# Altium footprint library FootprintSMD.PcbLib: 140 footprints (part 8 of 9)
Each footprint in its own frame and in the unit in brackets; x right, y up, seen from the top. Pads: shape width x height; smd on the part's side, far side on the other; paste and mask are expansions set on the pad; w line width, h text height; cw(c..) or ccw(c..) is an arc to the next point about the centre after c.
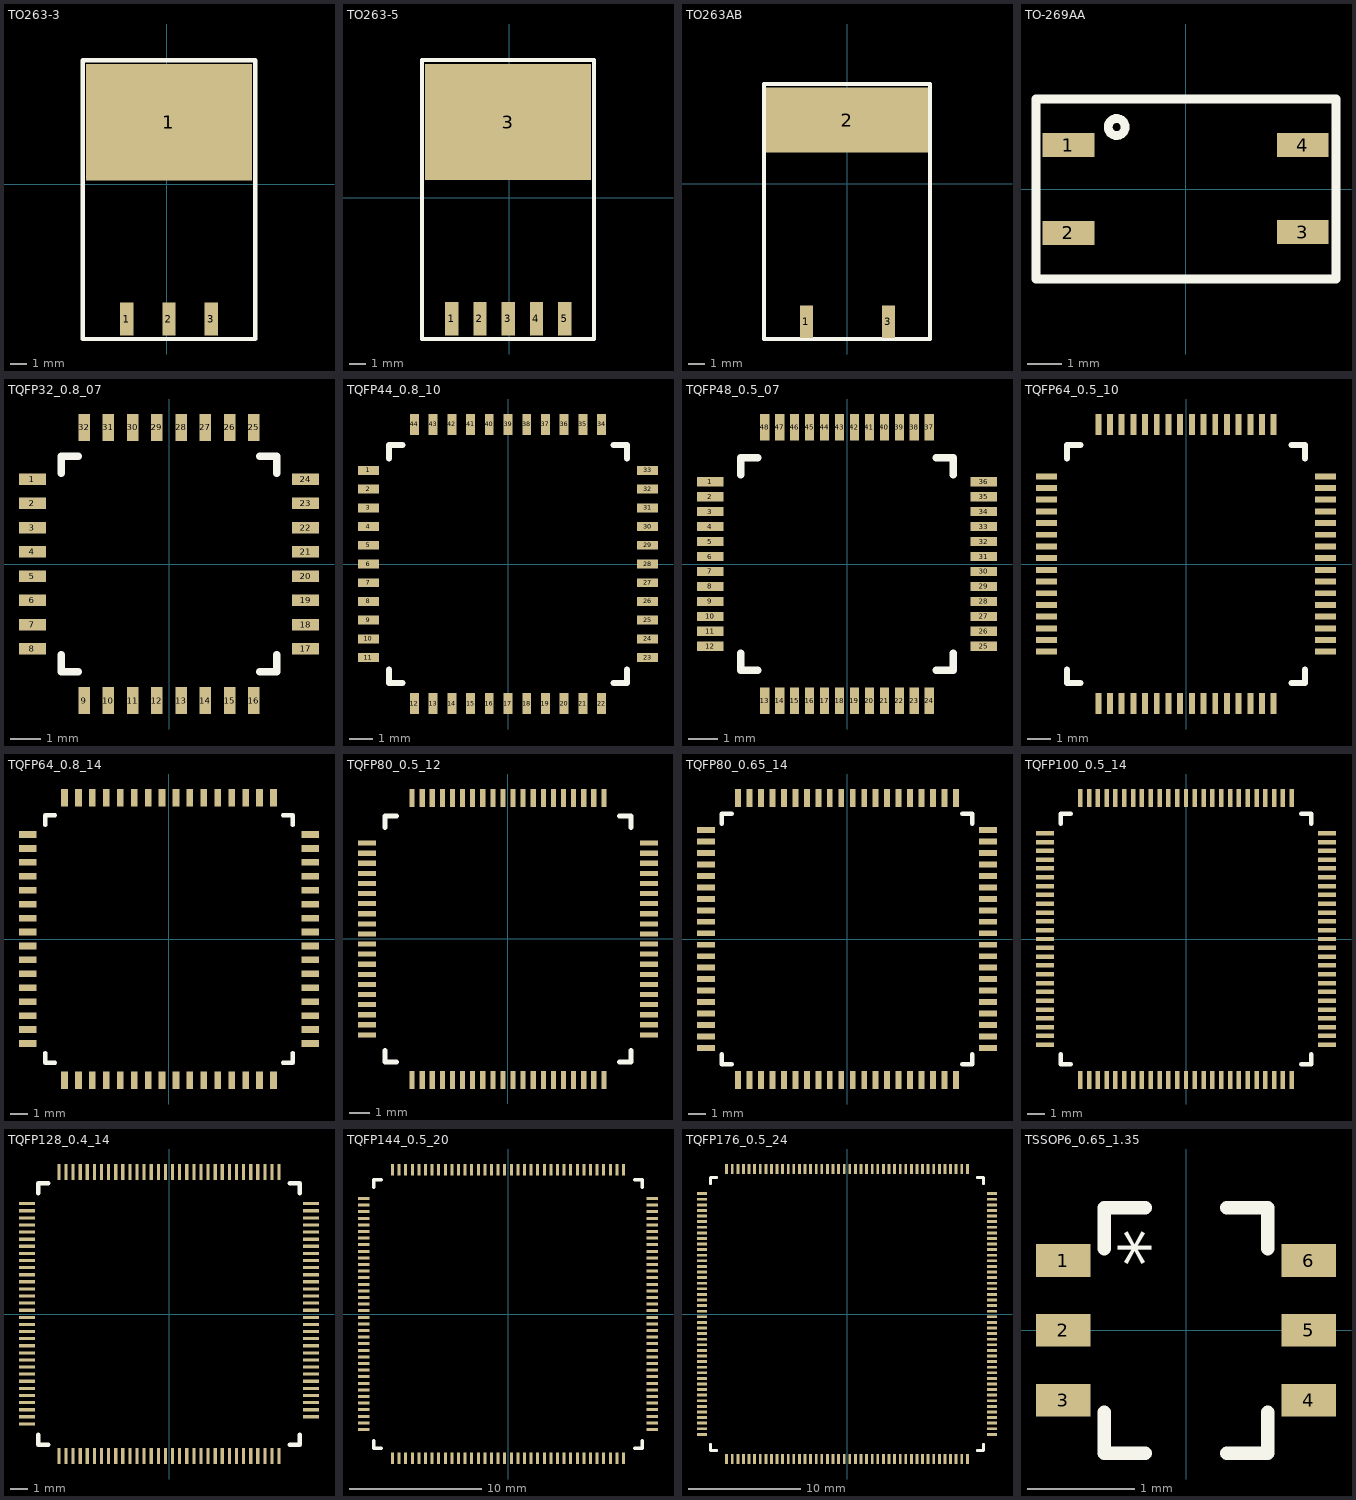
[diagram p7: the footprints below, top view; thin cyan lines are the x and y axes]

## TO263-3 [mm]
pads (4):
  rect 0.8x2 smd: 1(-2.418,-8.095) 2(0.122,-8.095) 3(2.662,-8.095)
  rect 10x7 smd: 1(0.122,3.741)
Top Overlay:
  lines w0.254: -5.055,-9.296 5.309,-9.296 5.309,7.468 -5.055,7.468 -5.055,-6.262 -5.055,-9.296
3D body "SW3dPS-TO263-3.STEP": height 4.78, standoff -0.02, extent -4.878,-8.742 5.122,6.928

## TO263-5 [mm]
pads (6):
  rect 0.8x2 smd: 1(-3.454,-7.286) 2(-1.754,-7.286) 3(-0.054,-7.286) 4(1.646,-7.286) 5(3.346,-7.286)
  rect 10x7 smd: 3(-0.054,4.55)
Top Overlay:
  lines w0.254: -5.232,-8.509 5.105,-8.509 5.105,8.28 -5.232,8.28 -5.232,-5.454 -5.232,-8.509
3D body "SW3dPS-TO263-5.STEP": height 4.79, standoff -0.01, extent -5.054,-7.933 4.946,7.737

## TO263AB [mm]
pads (3):
  rect 0.8x2 smd: 1(-2.525,-8.475) 3(2.525,-8.475)
  rect 10x4 smd: 2(-0.025,3.925)
Top Overlay:
  lines w0.254: 5.075,-9.55 5.075,6.147 -5.125,6.147 -5.125,-9.55 5.075,-9.55 ; 5.075,-9.55 5.075,-9.55
3D body "SW3dPS-DPAK.STEP": height 4.98, standoff -0.03, extent -5.08,-9.416 5.08,5.848

## TO-269AA [mm]
pads (4):
  rect 1.5x0.7 smd: 1(-3.4,1.275) 2(-3.4,-1.275) 3(3.4,-1.25) 4(3.4,1.275)
Top Overlay:
  circle w0.254: c-2,1.8 r0.246
  lines w0.254: -4.343,-2.616 -4.343,2.616 4.369,2.616 4.369,-2.616 -4.343,-2.616
3D body "User Library-TO-269AA_jam.STEP": height 2.7, standoff 0, extent -3.52,-2.475 3.52,2.475

## TQFP32_0.8_07 [mil]
pads (32):
  rect 35x15 smd: 1(-177.32,110.24) 2(-177.32,78.74) 3(-177.32,47.24) 4(-177.32,15.75) 5(-177.32,-15.75) 6(-177.32,-47.24) 7(-177.32,-78.74) 8(-177.32,-110.24) 17(177.32,-110.24) 18(177.32,-78.74) 19(177.32,-47.24) 20(177.32,-15.75) 21(177.32,15.75) 22(177.32,47.24) 23(177.32,78.74) 24(177.32,110.24)
  rect 15x35 smd: 9(-110.24,-177.32) 10(-78.74,-177.32) 11(-47.24,-177.32) 12(-15.75,-177.32) 13(15.75,-177.32) 14(47.24,-177.32) 15(78.74,-177.32) 16(110.24,-177.32) 25(110.24,177.32) 26(78.74,177.32) 27(47.24,177.32) 28(15.75,177.32) 29(-15.75,177.32) 30(-47.24,177.32) 31(-78.74,177.32) 32(-110.24,177.32)
Top Overlay:
  lines w10: -140,-117.87 -140,-140 -117.87,-140 ; -140,117.87 -140,140 -117.87,140 ; 117.87,-140 140,-140 140,-117.87 ; 117.87,140 140,140 140,117.87
3D body "User Library-LQFP32-0_8.STEP": height 64.96, standoff -0.52, extent -177.17,-177.92 178.68,177.92

## TQFP44_0.8_10 [mil]
pads (44):
  rect 35x15 smd: 1(-235,157.48) 2(-235,125.98) 3(-235,94.49) 4(-235,62.99) 5(-235,31.5) 6(-235,0) 7(-235,-31.5) 8(-235,-62.99) 9(-235,-94.49) 10(-235,-125.98) 11(-235,-157.48) 23(235,-157.48) 24(235,-125.98) 25(235,-94.49) 26(235,-62.99) 27(235,-31.5) 28(235,0) 29(235,31.5) 30(235,62.99) 31(235,94.49) 32(235,125.98) 33(235,157.48)
  rect 15x35 smd: 12(-157.48,-235) 13(-125.98,-235) 14(-94.49,-235) 15(-62.99,-235) 16(-31.5,-235) 17(0,-235) 18(31.5,-235) 19(62.99,-235) 20(94.49,-235) 21(125.98,-235) 22(157.48,-235) 34(157.48,235) 35(125.98,235) 36(94.49,235) 37(62.99,235) 38(31.5,235) 39(0,235) 40(-31.5,235) 41(-62.99,235) 42(-94.49,235) 43(-125.98,235) 44(-157.48,235)
Top Overlay:
  lines w10: -200,-177.87 -200,-200 -177.87,-200 ; -200,177.87 -200,200 -177.87,200 ; 177.87,-200 200,-200 200,-177.87 ; 177.87,200 200,200 200,177.87
3D body "User Library-TQFP-44-1.STEP": height 43.31, standoff 0, extent -236.22,-236.22 236.22,236.22

## TQFP48_0.5_07 [mil]
pads (48):
  rect 35x12 smd: 1(-180,108.27) 2(-180,88.58) 3(-180,68.9) 4(-180,49.21) 5(-180,29.53) 6(-180,9.84) 7(-180,-9.84) 8(-180,-29.53) 9(-180,-49.21) 10(-180,-68.9) 11(-180,-88.58) 12(-180,-108.27) 25(180,-108.27) 26(180,-88.58) 27(180,-68.9) 28(180,-49.21) 29(180,-29.53) 30(180,-9.84) 31(180,9.84) 32(180,29.53) 33(180,49.21) 34(180,68.9) 35(180,88.58) 36(180,108.27)
  rect 12x35 smd: 13(-108.27,-180) 14(-88.58,-180) 15(-68.9,-180) 16(-49.21,-180) 17(-29.53,-180) 18(-9.84,-180) 19(9.84,-180) 20(29.53,-180) 21(49.21,-180) 22(68.9,-180) 23(88.58,-180) 24(108.27,-180) 37(108.27,180) 38(88.58,180) 39(68.9,180) 40(49.21,180) 41(29.53,180) 42(9.84,180) 43(-9.84,180) 44(-29.53,180) 45(-49.21,180) 46(-68.9,180) 47(-88.58,180) 48(-108.27,180)
Top Overlay:
  lines w10: -140,-117.87 -140,-140 -117.87,-140 ; -140,117.87 -140,140 -117.87,140 ; 117.87,-140 140,-140 140,-117.87 ; 117.87,140 140,140 140,117.87
3D body "User Library-LQFP48.STEP": height 59.06, standoff 0, extent -177.16,-177.17 177.17,177.16

## TQFP64_0.5_10 [mil]
pads (64):
  rect 35x10 smd: 1(-235,147.64) 2(-235,127.95) 3(-235,108.27) 4(-235,88.58) 5(-235,68.9) 6(-235,49.21) 7(-235,29.53) 8(-235,9.84) 9(-235,-9.84) 10(-235,-29.53) 11(-235,-49.21) 12(-235,-68.9) 13(-235,-88.58) 14(-235,-108.27) 15(-235,-127.95) 16(-235,-147.64) 33(235,-147.64) 34(235,-127.95) 35(235,-108.27) 36(235,-88.58) 37(235,-68.9) 38(235,-49.21) 39(235,-29.53) 40(235,-9.84) 41(235,9.84) 42(235,29.53) 43(235,49.21) 44(235,68.9) 45(235,88.58) 46(235,108.27) 47(235,127.95) 48(235,147.64)
  rect 10x35 smd: 17(-147.64,-235) 18(-127.95,-235) 19(-108.27,-235) 20(-88.58,-235) 21(-68.9,-235) 22(-49.21,-235) 23(-29.53,-235) 24(-9.84,-235) 25(9.84,-235) 26(29.53,-235) 27(49.21,-235) 28(68.9,-235) 29(88.58,-235) 30(108.27,-235) 31(127.95,-235) 32(147.64,-235) 49(147.64,235) 50(127.95,235) 51(108.27,235) 52(88.58,235) 53(68.9,235) 54(49.21,235) 55(29.53,235) 56(9.84,235) 57(-9.84,235) 58(-29.53,235) 59(-49.21,235) 60(-68.9,235) 61(-88.58,235) 62(-108.27,235) 63(-127.95,235) 64(-147.64,235)
Top Overlay:
  lines w10: -200,-177.87 -200,-200 -177.87,-200 ; -200,177.87 -200,200 -177.87,200 ; 177.87,-200 200,-200 200,-177.87 ; 177.87,200 200,200 200,177.87
3D body "User Library-lqpf64.STEP": height 59.06, standoff 0.79, extent -236.21,-236.21 236.23,236.23

## TQFP64_0.8_14 [mil]
pads (64):
  rect 40x15 smd: 1(-319.21,236.22) 2(-319.21,204.72) 3(-319.21,173.23) 4(-319.21,141.73) 5(-319.21,110.24) 6(-319.21,78.74) 7(-319.21,47.24) 8(-319.21,15.75) 9(-319.21,-15.75) 10(-319.21,-47.24) 11(-319.21,-78.74) 12(-319.21,-110.24) 13(-319.21,-141.73) 14(-319.21,-173.23) 15(-319.21,-204.72) 16(-319.21,-236.22) 33(319.21,-236.22) 34(319.21,-204.72) 35(319.21,-173.23) 36(319.21,-141.73) 37(319.21,-110.24) 38(319.21,-78.74) 39(319.21,-47.24) 40(319.21,-15.75) 41(319.21,15.75) 42(319.21,47.24) 43(319.21,78.74) 44(319.21,110.24) 45(319.21,141.73) 46(319.21,173.23) 47(319.21,204.72) 48(319.21,236.22)
  rect 15x40 smd: 17(-236.22,-319.21) 18(-204.72,-319.21) 19(-173.23,-319.21) 20(-141.73,-319.21) 21(-110.24,-319.21) 22(-78.74,-319.21) 23(-47.24,-319.21) 24(-15.75,-319.21) 25(15.75,-319.21) 26(47.24,-319.21) 27(78.74,-319.21) 28(110.24,-319.21) 29(141.73,-319.21) 30(173.23,-319.21) 31(204.72,-319.21) 32(236.22,-319.21) 49(236.22,319.21) 50(204.72,319.21) 51(173.23,319.21) 52(141.73,319.21) 53(110.24,319.21) 54(78.74,319.21) 55(47.24,319.21) 56(15.75,319.21) 57(-15.75,319.21) 58(-47.24,319.21) 59(-78.74,319.21) 60(-110.24,319.21) 61(-141.73,319.21) 62(-173.23,319.21) 63(-204.72,319.21) 64(-236.22,319.21)
Top Overlay:
  lines w10: -280,-257.87 -280,-280 -257.87,-280 ; -280,257.87 -280,280 -257.87,280 ; 257.87,-280 280,-280 280,-257.87 ; 257.87,280 280,280 280,257.87
3D body "User Library-TQFP 64 14x14mm 0_8mm pitch.STEP": height 58.27, standoff -0.79, extent -314.95,-314.95 314.97,314.97

## TQFP80_0.5_12 [mil]
pads (80):
  rect 35x10 smd: 1(-275,187.01) 2(-275,167.32) 3(-275,147.64) 4(-275,127.95) 5(-275,108.27) 6(-275,88.58) 7(-275,68.9) 8(-275,49.21) 9(-275,29.53) 10(-275,9.84) 11(-275,-9.84) 12(-275,-29.53) 13(-275,-49.21) 14(-275,-68.9) 15(-275,-88.58) 16(-275,-108.27) 17(-275,-127.95) 18(-275,-147.64) 19(-275,-167.32) 20(-275,-187.01) 41(275,-187.01) 42(275,-167.32) 43(275,-147.64) 44(275,-127.95) 45(275,-108.27) 46(275,-88.58) 47(275,-68.9) 48(275,-49.21) 49(275,-29.53) 50(275,-9.84) 51(275,9.84) 52(275,29.53) 53(275,49.21) 54(275,68.9) 55(275,88.58) 56(275,108.27) 57(275,127.95) 58(275,147.64) 59(275,167.32) 60(275,187.01)
  rect 10x35 smd: 21(-187.01,-275) 22(-167.32,-275) 23(-147.64,-275) 24(-127.95,-275) 25(-108.27,-275) 26(-88.58,-275) 27(-68.9,-275) 28(-49.21,-275) 29(-29.53,-275) 30(-9.84,-275) 31(9.84,-275) 32(29.53,-275) 33(49.21,-275) 34(68.9,-275) 35(88.58,-275) 36(108.27,-275) 37(127.95,-275) 38(147.64,-275) 39(167.32,-275) 40(187.01,-275) 61(187.01,275) 62(167.32,275) 63(147.64,275) 64(127.95,275) 65(108.27,275) 66(88.58,275) 67(68.9,275) 68(49.21,275) 69(29.53,275) 70(9.84,275) 71(-9.84,275) 72(-29.53,275) 73(-49.21,275) 74(-68.9,275) 75(-88.58,275) 76(-108.27,275) 77(-127.95,275) 78(-147.64,275) 79(-167.32,275) 80(-187.01,275)
Top Overlay:
  lines w10: -240,-217.87 -240,-240 -217.87,-240 ; -240,217.87 -240,240 -217.87,240 ; 217.87,-240 240,-240 240,-217.87 ; 217.87,240 240,240 240,217.87
3D body "User Library-TQFP-80.STEP": height 41.34, standoff -0.39, extent -275.58,-275.59 275.6,275.59

## TQFP80_0.65_14 [mil]
pads (80):
  rect 40x13 smd: 1(-315,243.11) 2(-315,217.52) 3(-315,191.93) 4(-315,166.34) 5(-315,140.75) 6(-315,115.16) 7(-315,89.57) 8(-315,63.98) 9(-315,38.39) 10(-315,12.8) 11(-315,-12.8) 12(-315,-38.39) 13(-315,-63.98) 14(-315,-89.57) 15(-315,-115.16) 16(-315,-140.75) 17(-315,-166.34) 18(-315,-191.93) 19(-315,-217.52) 20(-315,-243.11) 41(315,-243.11) 42(315,-217.52) 43(315,-191.93) 44(315,-166.34) 45(315,-140.75) 46(315,-115.16) 47(315,-89.57) 48(315,-63.98) 49(315,-38.39) 50(315,-12.8) 51(315,12.8) 52(315,38.39) 53(315,63.98) 54(315,89.57) 55(315,115.16) 56(315,140.75) 57(315,166.34) 58(315,191.93) 59(315,217.52) 60(315,243.11)
  rect 13x40 smd: 21(-243.11,-315) 22(-217.52,-315) 23(-191.93,-315) 24(-166.34,-315) 25(-140.75,-315) 26(-115.16,-315) 27(-89.57,-315) 28(-63.98,-315) 29(-38.39,-315) 30(-12.8,-315) 31(12.8,-315) 32(38.39,-315) 33(63.98,-315) 34(89.57,-315) 35(115.16,-315) 36(140.75,-315) 37(166.34,-315) 38(191.93,-315) 39(217.52,-315) 40(243.11,-315) 61(243.11,315) 62(217.52,315) 63(191.93,315) 64(166.34,315) 65(140.75,315) 66(115.16,315) 67(89.57,315) 68(63.98,315) 69(38.39,315) 70(12.8,315) 71(-12.8,315) 72(-38.39,315) 73(-63.98,315) 74(-89.57,315) 75(-115.16,315) 76(-140.75,315) 77(-166.34,315) 78(-191.93,315) 79(-217.52,315) 80(-243.11,315)
Top Overlay:
  lines w10: -280,-257.87 -280,-280 -257.87,-280 ; -280,257.87 -280,280 -257.87,280 ; 257.87,-280 280,-280 280,-257.87 ; 257.87,280 280,280 280,257.87
3D body "User Library-LQFP-80 14x14.STEP": height 61.02, standoff -1.41, extent -315.14,-315.32 315.14,314.96

## TQFP100_0.5_14 [mil]
pads (100):
  rect 40x10 smd: 1(-315,236.22) 2(-315,216.54) 3(-315,196.85) 4(-315,177.17) 5(-315,157.48) 6(-315,137.8) 7(-315,118.11) 8(-315,98.43) 9(-315,78.74) 10(-315,59.06) 11(-315,39.37) 12(-315,19.69) 13(-315,0) 14(-315,-19.68) 15(-315,-39.37) 16(-315,-59.05) 17(-315,-78.74) 18(-315,-98.42) 19(-315,-118.11) 20(-315,-137.8) 21(-315,-157.48) 22(-315,-177.17) 23(-315,-196.85) 24(-315,-216.54) 25(-315,-236.22) 51(315,-236.22) 52(315,-216.54) 53(315,-196.85) 54(315,-177.17) 55(315,-157.48) 56(315,-137.8) 57(315,-118.11) 58(315,-98.43) 59(315,-78.74) 60(315,-59.06) 61(315,-39.37) 62(315,-19.69) 63(315,0) 64(315,19.68) 65(315,39.37) 66(315,59.05) 67(315,78.74) 68(315,98.43) 69(315,118.11) 70(315,137.8) 71(315,157.48) 72(315,177.17) 73(315,196.85) 74(315,216.54) 75(315,236.22)
  rect 10x40 smd: 26(-236.22,-315) 27(-216.54,-315) 28(-196.85,-315) 29(-177.17,-315) 30(-157.48,-315) 31(-137.8,-315) 32(-118.11,-315) 33(-98.43,-315) 34(-78.74,-315) 35(-59.06,-315) 36(-39.37,-315) 37(-19.69,-315) 38(0,-315) 39(19.68,-315) 40(39.37,-315) 41(59.06,-315) 42(78.74,-315) 43(98.43,-315) 44(118.11,-315) 45(137.8,-315) 46(157.48,-315) 47(177.17,-315) 48(196.85,-315) 49(216.54,-315) 50(236.22,-315) 76(236.22,315) 77(216.54,315) 78(196.85,315) 79(177.17,315) 80(157.48,315) 81(137.8,315) 82(118.11,315) 83(98.43,315) 84(78.74,315) 85(59.06,315) 86(39.37,315) 87(19.69,315) 88(0,315) 89(-19.68,315) 90(-39.37,315) 91(-59.06,315) 92(-78.74,315) 93(-98.43,315) 94(-118.11,315) 95(-137.8,315) 96(-157.48,315) 97(-177.17,315) 98(-196.85,315) 99(-216.54,315) 100(-236.22,315)
Top Overlay:
  lines w10: -280,-257.87 -280,-280 -257.87,-280 ; -280,257.87 -280,280 -257.87,280 ; 257.87,-280 280,-280 280,-257.87 ; 257.87,280 280,280 280,257.87
3D body "User Library-LQFP100_Grid_0_5.STEP": height 61.81, standoff -1.16, extent -314.96,-314.96 314.96,314.96

## TQFP128_0.4_14 [mil]
pads (128):
  rect 35x7 smd: 1(-315,244.59) 2(-315,228.84) 3(-315,213.09) 4(-315,197.34) 5(-315,181.59) 6(-315,165.85) 7(-315,150.1) 8(-315,134.35) 9(-315,118.6) 10(-315,102.85) 11(-315,87.11) 12(-315,71.36) 13(-315,55.61) 14(-315,39.86) 15(-315,24.11) 16(-315,8.37) 17(-315,-7.38) 18(-315,-23.13) 19(-315,-38.88) 20(-315,-54.63) 21(-315,-70.37) 22(-315,-86.12) 23(-315,-101.87) 24(-315,-117.62) 25(-315,-133.37) 26(-315,-149.11) 27(-315,-164.86) 28(-315,-180.61) 29(-315,-196.36) 30(-315,-212.11) 31(-315,-227.85) 32(-315,-243.6) 65(315,-227.85) 66(315,-212.11) 67(315,-196.36) 68(315,-180.61) 69(315,-164.86) 70(315,-149.11) 71(315,-133.37) 72(315,-117.62) 73(315,-117.62) 74(315,-101.87) 75(315,-86.12) 76(315,-70.37) 77(315,-54.63) 78(315,-38.88) 79(315,-23.13) 80(315,-7.38) 81(315,8.37) 82(315,24.11) 83(315,39.86) 84(315,55.61) 85(315,71.36) 86(315,87.11) 87(315,102.85) 88(315,118.6) 89(315,134.35) 90(315,150.1) 91(315,165.85) 92(315,181.59) 93(315,197.34) 94(315,213.09) 95(315,228.84) 96(315,244.59)
  rect 7x35 smd: 33(-244.09,-315) 34(-228.35,-315) 35(-212.6,-315) 36(-196.85,-315) 37(-181.1,-315) 38(-165.35,-315) 39(-149.61,-315) 40(-133.86,-315) 41(-118.11,-315) 42(-102.36,-315) 43(-86.61,-315) 44(-70.87,-315) 45(-55.12,-315) 46(-39.37,-315) 47(-23.62,-315) 48(-7.87,-315) 49(7.87,-315) 50(23.62,-315) 51(39.37,-315) 52(55.12,-315) 53(70.87,-315) 54(86.61,-315) 55(102.36,-315) 56(118.11,-315) 57(133.86,-315) 58(149.61,-315) 59(165.35,-315) 60(181.1,-315) 61(196.85,-315) 62(212.6,-315) 63(228.35,-315) 64(244.09,-315) 97(244.09,315) 98(228.35,315) 99(212.6,315) 100(196.85,315) 101(181.1,315) 102(165.35,315) 103(149.61,315) 104(133.86,315) 105(118.11,315) 106(102.36,315) 107(86.61,315) 108(70.87,315) 109(55.12,315) 110(39.37,315) 111(23.62,315) 112(7.87,315) 113(-7.87,315) 114(-23.62,315) 115(-39.37,315) 116(-55.12,315) 117(-70.87,315) 118(-86.61,315) 119(-102.36,315) 120(-118.11,315) 121(-133.86,315) 122(-149.61,315) 123(-165.35,315) 124(-181.1,315) 125(-196.85,315) 126(-212.6,315) 127(-228.35,315) 128(-244.09,315)
Top Overlay:
  lines w10: -290,-267.87 -290,-290 -267.87,-290 ; -290,267.87 -290,290 -267.87,290 ; 267.87,-290 290,-290 290,-267.87 ; 267.87,290 290,290 290,267.87
3D body "User Library-TQFP128.STEP": height 43.31, standoff 0, extent -315.3,-315.3 315.3,315.31

## TQFP144_0.5_20 [mil]
pads (144):
  rect 35x9 smd: 1(-430,344.49) 2(-430,324.8) 3(-430,305.12) 4(-430,285.43) 5(-430,265.75) 6(-430,246.06) 7(-430,226.38) 8(-430,206.69) 9(-430,187.01) 10(-430,167.32) 11(-430,147.64) 12(-430,127.95) 13(-430,108.27) 14(-430,88.58) 15(-430,68.9) 16(-430,49.21) 17(-430,29.53) 18(-430,9.84) 19(-430,-9.84) 20(-430,-29.53) 21(-430,-49.21) 22(-430,-68.9) 23(-430,-88.58) 24(-430,-108.27) 25(-430,-127.95) 26(-430,-147.64) 27(-430,-167.32) 28(-430,-187.01) 29(-430,-206.69) 30(-430,-226.38) 31(-430,-246.06) 32(-430,-265.75) 33(-430,-285.43) 34(-430,-305.12) 35(-430,-324.8) 36(-430,-344.49) 73(430,-344.49) 74(430,-324.8) 75(430,-305.12) 76(430,-285.43) 77(430,-265.75) 78(430,-246.06) 79(430,-226.38) 80(430,-206.69) 81(430,-187.01) 82(430,-167.32) 83(430,-147.64) 84(430,-127.95) 85(430,-108.27) 86(430,-88.58) 87(430,-68.9) 88(430,-49.21) 89(430,-29.53) 90(430,-9.84) 91(430,9.84) 92(430,29.53) 93(430,49.21) 94(430,68.9) 95(430,88.58) 96(430,108.27) 97(430,127.95) 98(430,147.64) 99(430,167.32) 100(430,187.01) 101(430,206.69) 102(430,226.38) 103(430,246.06) 104(430,265.75) 105(430,285.43) 106(430,305.12) 107(430,324.8) 108(430,344.49)
  rect 9x35 smd: 37(-344.49,-430) 38(-324.8,-430) 39(-305.12,-430) 40(-285.43,-430) 41(-265.75,-430) 42(-246.06,-430) 43(-226.38,-430) 44(-206.69,-430) 45(-187.01,-430) 46(-167.32,-430) 47(-147.64,-430) 48(-127.95,-430) 49(-108.27,-430) 50(-88.58,-430) 51(-68.9,-430) 52(-49.21,-430) 53(-29.53,-430) 54(-9.84,-430) 55(9.84,-430) 56(29.53,-430) 57(49.21,-430) 58(68.9,-430) 59(88.58,-430) 60(108.27,-430) 61(127.95,-430) 62(147.64,-430) 63(167.32,-430) 64(187.01,-430) 65(206.69,-430) 66(226.38,-430) 67(246.06,-430) 68(265.75,-430) 69(285.43,-430) 70(305.12,-430) 71(324.8,-430) 72(344.49,-430) 109(344.49,430) 110(324.8,430) 111(305.12,430) 112(285.43,430) 113(265.75,430) 114(246.06,430) 115(226.38,430) 116(206.69,430) 117(187.01,430) 118(167.32,430) 119(147.64,430) 120(127.95,430) 121(108.27,430) 122(88.58,430) 123(68.9,430) 124(49.21,430) 125(29.53,430) 126(9.84,430) 127(-9.84,430) 128(-29.53,430) 129(-49.21,430) 130(-68.9,430) 131(-88.58,430) 132(-108.27,430) 133(-127.95,430) 134(-147.64,430) 135(-167.32,430) 136(-187.01,430) 137(-206.69,430) 138(-226.38,430) 139(-246.06,430) 140(-265.75,430) 141(-285.43,430) 142(-305.12,430) 143(-324.8,430) 144(-344.49,430)
Top Overlay:
  lines w10: -400,-377.87 -400,-400 -377.87,-400 ; -400,377.87 -400,400 -377.87,400 ; 377.87,-400 400,-400 400,-377.87 ; 377.87,400 400,400 400,377.87
3D body "User Library-LQFP144-0_5.STEP": height 61.02, standoff -0.87, extent -428.58,-428.58 428.6,428.6

## TQFP176_0.5_24 [mil]
pads (176):
  rect 35x10 smd: 1(-510,423.23) 2(-510,403.54) 3(-510,383.86) 4(-510,364.17) 5(-510,344.49) 6(-510,324.8) 7(-510,305.12) 8(-510,285.43) 9(-510,265.75) 10(-510,246.06) 11(-510,226.38) 12(-510,206.69) 13(-510,187.01) 14(-510,167.32) 15(-510,147.64) 16(-510,127.95) 17(-510,108.27) 18(-510,88.58) 19(-510,68.9) 20(-510,49.21) 21(-510,29.53) 22(-510,9.84) 23(-510,-9.84) 24(-510,-29.53) 25(-510,-49.21) 26(-510,-68.9) 27(-510,-88.58) 28(-510,-108.27) 29(-510,-127.95) 30(-510,-147.64) 31(-510,-167.32) 32(-510,-187.01) 33(-510,-206.69) 34(-510,-226.38) 35(-510,-246.06) 36(-510,-265.75) 37(-510,-285.43) 38(-510,-305.12) 39(-510,-324.8) 40(-510,-344.49) 41(-510,-364.17) 42(-510,-383.86) 43(-510,-403.54) 44(-510,-423.23) 89(510,-423.23) 90(510,-403.54) 91(510,-383.86) 92(510,-364.17) 93(510,-344.49) 94(510,-324.8) 95(510,-305.12) 96(510,-285.43) 97(510,-265.75) 98(510,-246.06) 99(510,-226.38) 100(510,-206.69) 101(510,-187.01) 102(510,-167.32) 103(510,-147.64) 104(510,-127.95) 105(510,-108.27) 106(510,-88.58) 107(510,-68.9) 108(510,-49.21) 109(510,-29.53) 110(510,-9.84) 111(510,9.84) 112(510,29.53) 113(510,49.21) 114(510,68.9) 115(510,88.58) 116(510,108.27) 117(510,127.95) 118(510,147.64) 119(510,167.32) 120(510,187.01) 121(510,206.69) 122(510,226.38) 123(510,246.06) 124(510,265.75) 125(510,285.43) 126(510,305.12) 127(510,324.8) 128(510,344.49) 129(510,364.17) 130(510,383.86) 131(510,403.54) 132(510,423.23)
  rect 10x35 smd: 45(-423.23,-510) 46(-403.54,-510) 47(-383.86,-510) 48(-364.17,-510) 49(-344.49,-510) 50(-324.8,-510) 51(-305.12,-510) 52(-285.43,-510) 53(-265.75,-510) 54(-246.06,-510) 55(-226.38,-510) 56(-206.69,-510) 57(-187.01,-510) 58(-167.32,-510) 59(-147.64,-510) 60(-127.95,-510) 61(-108.27,-510) 62(-88.58,-510) 63(-68.9,-510) 64(-49.21,-510) 65(-29.53,-510) 66(-9.84,-510) 67(9.84,-510) 68(29.53,-510) 69(49.21,-510) 70(68.9,-510) 71(88.58,-510) 72(108.27,-510) 73(127.95,-510) 74(147.64,-510) 75(167.32,-510) 76(187.01,-510) 77(206.69,-510) 78(226.38,-510) 79(246.06,-510) 80(265.75,-510) 81(285.43,-510) 82(305.12,-510) 83(324.8,-510) 84(344.49,-510) 85(364.17,-510) 86(383.86,-510) 87(403.54,-510) 88(423.23,-510) 133(423.23,510) 134(403.54,510) 135(383.86,510) 136(364.17,510) 137(344.49,510) 138(324.8,510) 139(305.12,510) 140(285.43,510) 141(265.75,510) 142(246.06,510) 143(226.38,510) 144(206.69,510) 145(187.01,510) 146(167.32,510) 147(147.64,510) 148(127.95,510) 149(108.27,510) 150(88.58,510) 151(68.9,510) 152(49.21,510) 153(29.53,510) 154(9.84,510) 155(-9.84,510) 156(-29.53,510) 157(-49.21,510) 158(-68.9,510) 159(-88.58,510) 160(-108.27,510) 161(-127.95,510) 162(-147.64,510) 163(-167.32,510) 164(-187.01,510) 165(-206.69,510) 166(-226.38,510) 167(-246.06,510) 168(-265.75,510) 169(-285.43,510) 170(-305.12,510) 171(-324.8,510) 172(-344.49,510) 173(-364.17,510) 174(-383.86,510) 175(-403.54,510) 176(-423.23,510)
Top Overlay:
  lines w10: -480,-457.87 -480,-480 -457.87,-480 ; -480,457.87 -480,480 -457.87,480 ; 457.87,-480 480,-480 480,-457.87 ; 457.87,480 480,480 480,457.87
3D body "User Library-LQFP176-0_5.STEP": height 61.02, standoff -0.87, extent -507.32,-507.32 507.33,507.33

## TSSOP6_0.65_1.35 [mil]
pads (6):
  rect 20x12 smd: 1(-45,25.59) 2(-45,0) 3(-45,-25.59) 4(45,-25.59) 5(45,0) 6(45,25.59)
Top Overlay:
  lines w5: -30,-30 -30,-45 -15,-45 ; -30,30 -30,45 -15,45 ; 15,-45 30,-45 30,-30 ; 15,45 30,45 30,30
  text "*" at -4.67,37 h20
3D body "User Library-TSSOP-6 (SOT-23-6 PITCH 0_65).STEP": height 42.8, standoff -0.91, extent -44.29,-44.29 44.29,44.3